# Altium footprint library 7SEG.PCBLIB: 23 footprints (part 1 of 2)
Each footprint in its own frame and in the unit in brackets; x right, y up, seen from the top. Pads: shape width x height; smd on the part's side, far side on the other; paste and mask are expansions set on the pad; w line width, h text height; cw(c..) or ccw(c..) is an arc to the next point about the centre after c.
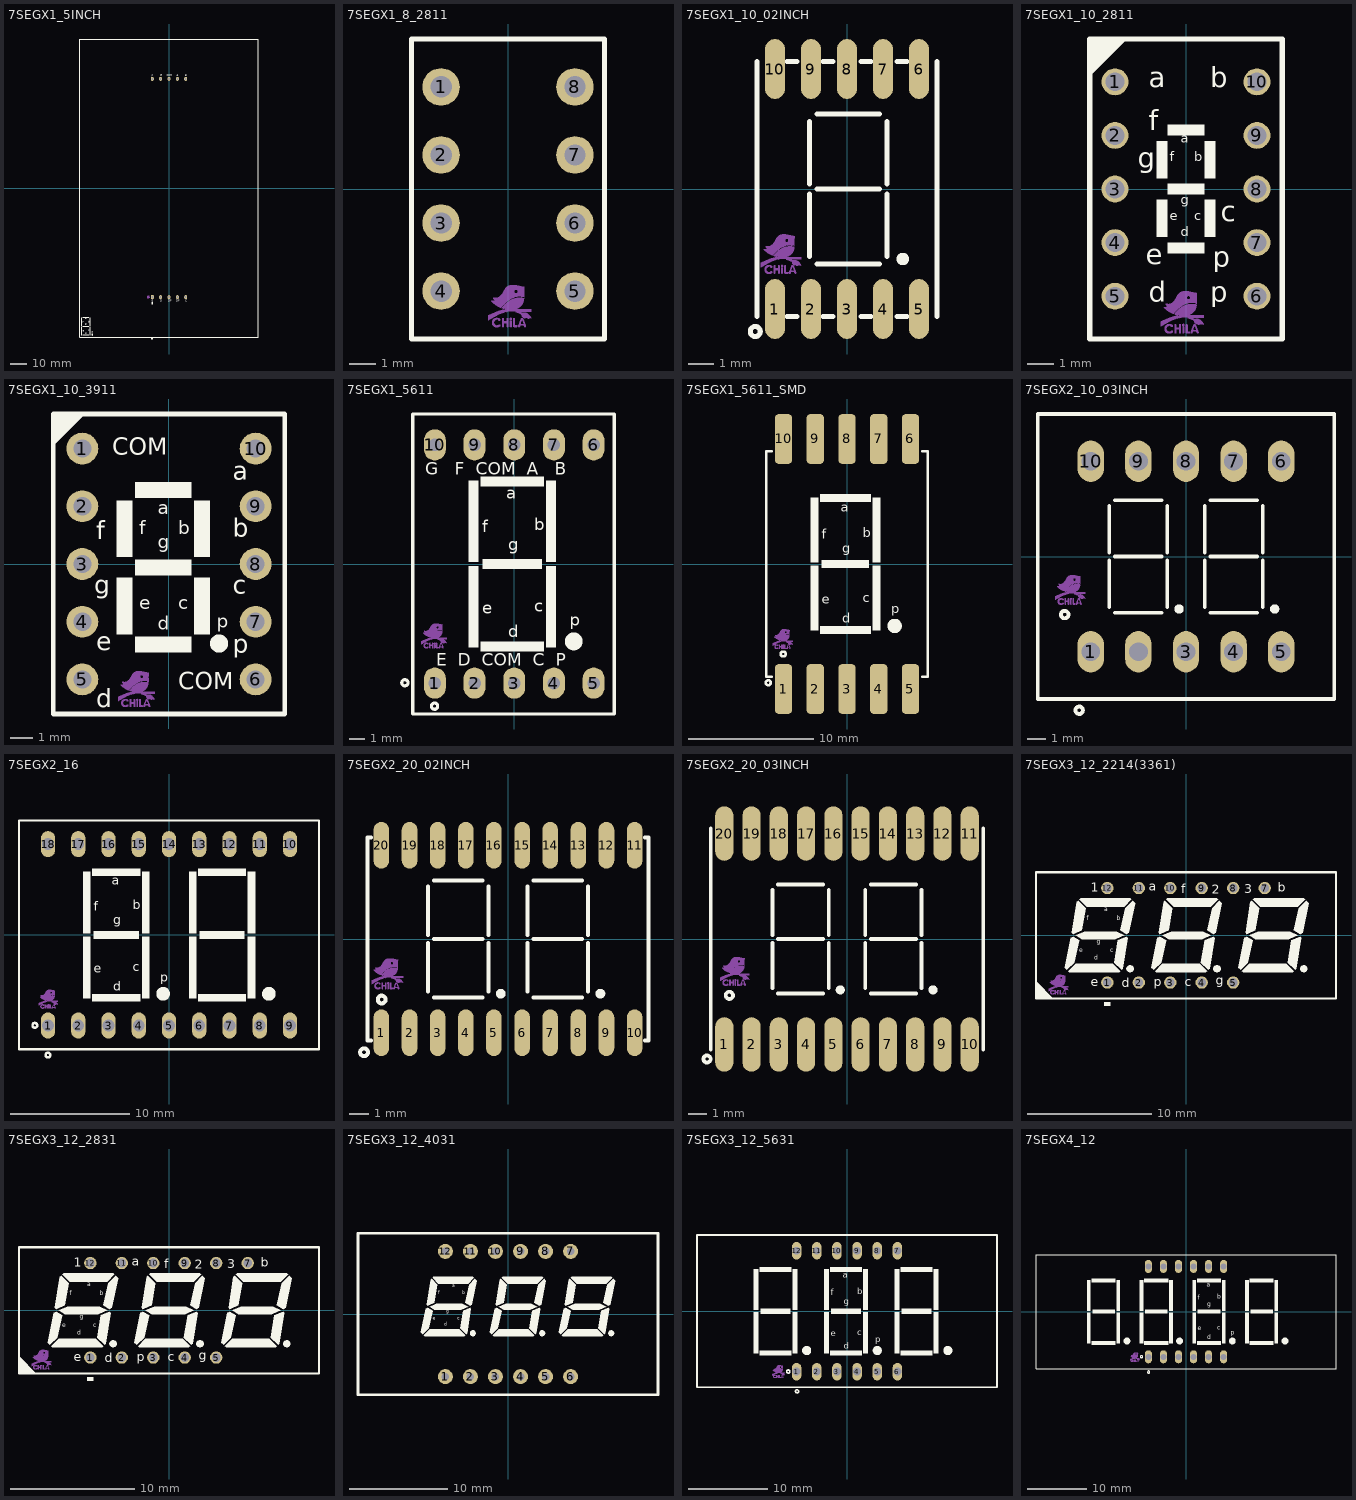
[diagram p0: the footprints below, top view; thin cyan lines are the x and y axes]

## 7SEGX1_5INCH [mm] "7SEG single 5INCH, 10pin, Pitch: 5.08mm, 180X108mm"
pads (10):
  rrect50% 1.8x2.4 hole 1.2: 1(-10.1,-66)
  oval 1.8x2.4 hole 1.2: 2(-5.1,-66) 3(0,-66) 4(5.1,-66) 5(10.1,-66) 6(10.1,66) 7(5.1,66) 8(0,66) 9(-5.1,66) 10(-10.1,66)
TopOverlay:
  circle w0.635: c-46.39,-88.653 r0.254
  circle w0.2: c-10.1,-69.7 r0.4
  circle w0.2: c-10.2,-90.9 r0.4
  rectangle: -52.232,-84.03 -48.422,-83.37
  rectangle: -52.359,-89.288 -48.295,-88.653
  rectangle: -52.359,-78.747 -48.295,-78.112
  rectangle: -48.168,-89.034 -47.533,-83.827
  rectangle: -48.168,-83.573 -47.533,-78.366
  rectangle: -53.121,-83.573 -52.486,-78.366
  rectangle: -53.121,-89.034 -52.486,-83.827
  lines w0.2: -54.1,-90.1 54.1,-90.1 54.1,90.1 -54.1,90.1 -54.1,-90.1
  text "E" at -10.3,-68.8 h1
  text "D" at -5.4,-68.7 h1
  text "DP" at -0.6,-68.7 h1
  text "DP" at 4.4,-68.7 h1
  text "C" at 9.8,-68.7 h1
  text "g" at -50.581,-82.811 h0.76
  text "p" at -46.644,-87.637 h0.76
  text "b" at -48.93,-81.541 h0.76
  text "e" at -52.232,-86.875 h0.76
  text "c" at -48.93,-86.748 h0.76
  text "d" at -50.581,-88.399 h0.76
  text "f" at -52.232,-81.668 h0.76
  text "a" at -50.708,-79.509 h0.76
  text "B" at 9.8,67.5 h1
  text "A" at 4.7,67.6 h1
  text "COM" at -1.3,67.5 h1
  text "G" at -5.4,67.5 h1
  text "F" at -10.3,67.4 h1
Mechanical16:
  drawing of 8 lines, arcs and shapes, not listed
3D body "User Library-7Segment_5inch.step": height 16, standoff -4.4, extent -54,-90 54,90

## 7SEGX1_8_2811 [mm] "7SEG single 8pin Pitch: 2.54mm  2811 0.28\" 8X10mm"
height 6
pads (8):
  round 1.4 / inner round 1.4 / far side oval 1.6x1.4 hole 0.8: 1(-2.5,3.81) 2(-2.5,1.27) 3(-2.5,-1.27) 4(-2.5,-3.81) 5(2.5,-3.81) 6(2.5,-1.27) 7(2.5,1.27) 8(2.5,3.81)
TopOverlay:
  lines w0.2: -3.6,-5.6 3.6,-5.6 3.6,5.6 -3.6,5.6 -3.6,-5.6
Mechanical16:
  drawing of 8 lines, arcs and shapes, not listed
3D body "la-301xb.stp": height 5, standoff -3.8, extent -3.5,-5.5 3.5,5.5

## 7SEGX1_10_02INCH [mm] "7SEG single 10pin Pitch: 1.44mm  0.2\" 10X7mm"
pads (10):
  oval 0.8x2.4 smd: 1(-2.88,-4.8) 2(-1.44,-4.8) 3(0,-4.8) 4(1.44,-4.8) 5(2.88,-4.8) 6(2.88,4.8) 7(1.44,4.8) 8(0,4.8) 9(-1.44,4.8) 10(-2.88,4.8)
TopOverlay:
  circle w0.25: c2.23,-2.8 r0.125
  circle w0.2: c-3.67,-5.7 r0.2
  lines w0.2: -3.6,-5.1 -3.6,5.1 ; -2.4,-5.1 -2,-5.1 ; -2.4,5.1 -2,5.1 ; -1.5,-2.7 -1.5,-0.2 ; -1.5,0.2 -1.5,2.7 ; -1.2,-3 1.3,-3 ; -1.2,0 1.3,0 ; -1.2,3 1.3,3 ; -0.96,-5.1 -0.56,-5.1 ; -0.96,5.1 -0.56,5.1 ; 0.56,-5.1 0.96,-5.1 ; 0.56,5.1 0.96,5.1 ; 1.6,-2.7 1.6,-0.2 ; 1.6,0.2 1.6,2.7 ; 2,-5.1 2.4,-5.1 ; 2,5.1 2.4,5.1 ; 3.6,-5.1 3.6,5.1
Mechanical16:
  drawing of 8 lines, arcs and shapes, not listed
3D body "ACSX02-41.STEP": height 3, standoff -0.05, extent -3.45,-5 3.45,5

## 7SEGX1_10_2811 [mm] "7SEG single 10pin Pitch: 2.54mm  2811 0.28\" 8X10mm"
height 6
pads (10):
  round 1 / inner round 1 / far side oval 1.4x1.2 hole 0.7: 1(-2.65,4) 2(-2.65,2) 3(-2.65,0) 4(-2.65,-2) 5(-2.65,-4) 6(2.65,-4) 7(2.65,-2) 8(2.65,0) 9(2.65,2) 10(2.65,4)
TopOverlay:
  rectangle: -0.7,-2.4 0.7,-2
  region: -1.1,-0.4 -1.1,-1.8 -0.7,-1.8 -0.7,-0.4
  region: 0.7,-0.4 0.7,-1.8 1.1,-1.8 1.1,-0.4
  rectangle: -0.7,-0.2 0.7,0.2
  region: 0.7,1.8 0.7,0.4 1.1,0.4 1.1,1.8
  region: -1.1,1.8 -1.1,0.4 -0.7,0.4 -0.7,1.8
  rectangle: -0.7,2 0.7,2.4
  region: -3.6,5.6 -2.2,5.6 -3.6,4.2
  lines w0.2: -3.6,-5.6 -3.6,5.6 3.6,5.6 3.6,-5.6 -3.6,-5.6
  text "p" at 1,-2.9 h0.75
  text "p" at 0.9,-4.2 h0.75
  text "a" at -1.4,3.8 h0.75
  text "d" at -1.4,-4.2 h0.75
  text "e" at -1.5,-2.8 h0.75
  text "f" at -1.4,2.2 h0.75
  text "b" at 0.9,3.8 h0.75
  text "g" at -1.8,0.8 h0.75
  text "c" at 1.3,-1.2 h0.75
  text "a" at -0.2,1.6 h0.6
  text "f" at -0.6,0.9 h0.6
  text "d" at -0.2,-1.9 h0.6
  text "c" at 0.3,-1.3 h0.6
  text "e" at -0.6,-1.3 h0.6
  text "b" at 0.3,0.9 h0.6
  text "g" at -0.2,-0.7 h0.6
Mechanical16:
  drawing of 8 lines, arcs and shapes, not listed
3D body "la-301xb.stp": height 5, standoff -3.8, extent -3.5,-5.5 3.5,5.5

## 7SEGX1_10_3911 [mm] "7SEG single 10pin Pitch: 2.54mm  3911 0.39\" 10X13mm"
height 7
pads (10):
  round 1.4 / inner round 1.4 / far side oval 2x1.4 hole 0.8: 1(-3.81,5.08) 2(-3.81,2.54) 3(-3.81,0) 4(-3.81,-2.54) 5(-3.81,-5.08) 6(3.81,-5.08) 7(3.81,-2.54) 8(3.81,0) 9(3.81,2.54) 10(3.81,5.08)
TopOverlay:
  circle w0.4: c2.2,-3.5 r0.2
  rectangle: -1.5,-0.5 1,0.2
  region: -1.6,0.3 -1.6,2.8 -2.3,2.8 -2.3,0.3
  rectangle: -1.5,2.9 1,3.6
  region: -2.3,-0.6 -2.3,-3.1 -1.6,-3.1 -1.6,-0.6
  region: 1.1,-0.6 1.1,-3.1 1.8,-3.1 1.8,-0.6
  region: 1.8,0.3 1.8,2.8 1.1,2.8 1.1,0.3
  rectangle: -1.5,-3.9 1,-3.2
  region: -5.1,6.6 -3.7,6.6 -5.1,5.2
  lines w0.2: -5.1,-6.6 -5.1,6.6 5.1,6.6 5.1,-6.6 -5.1,-6.6
  text "p" at 2.8,-3.9 h0.8
  text "a" at 2.8,3.7 h0.8
  text "d" at -3.2,-6.3 h0.8
  text "COM" at 0.4,-5.5 h0.76
  text "COM" at -2.5,4.8 h0.76
  text "e" at -3.2,-3.8 h0.8
  text "f" at -3.2,1.1 h0.8
  text "b" at 2.8,1.2 h0.8
  text "g" at -3.3,-1.3 h0.8
  text "c" at 2.8,-1.3 h0.8
  text "a" at -0.5,2.2 h0.6
  text "f" at -1.3,1.3 h0.6
  text "d" at -0.5,-2.9 h0.6
  text "c" at 0.4,-2 h0.6
  text "e" at -1.3,-2 h0.6
  text "b" at 0.4,1.3 h0.6
  text "p" at 2.1,-2.8 h0.6
  text "g" at -0.5,0.689 h0.6
Mechanical16:
  drawing of 8 lines, arcs and shapes, not listed
3D body "User Library-King Bright SA39-11.step": height 7, standoff -4, extent -5,-6.5 5,6.5

## 7SEGX1_5611 [mm] "7SEG single 10pin Pitch: 2.54mm  19X12.5mm"
height 8
pads (10):
  oval 1.4x2 hole 0.8: 1(-5.08,-7.62) 2(-2.54,-7.62) 3(0,-7.62) 4(2.54,-7.62) 5(5.08,-7.62) 6(5.08,7.62) 7(2.54,7.62) 8(0,7.62) 9(-2.54,7.62) 10(-5.08,7.62)
TopOverlay:
  circle w0.635: c3.81,-4.953 r0.254
  circle w0.2: c-7,-7.6 r0.2
  circle w0.2: c-5.1,-9.1 r0.2
  rectangle: -2.032,-0.33 1.778,0.33
  rectangle: -2.159,-5.588 1.905,-4.953
  rectangle: -2.159,4.953 1.905,5.588
  rectangle: 2.032,-5.334 2.667,-0.127
  rectangle: 2.032,0.127 2.667,5.334
  rectangle: -2.921,0.127 -2.286,5.334
  rectangle: -2.921,-5.334 -2.286,-0.127
  lines w0.2: -6.5,-9.6 6.4,-9.6 6.4,9.6 -6.5,9.6 -6.5,-9.6
  text "g" at -0.381,0.889 h0.76
  text "p" at 3.556,-3.937 h0.76
  text "b" at 1.27,2.159 h0.76
  text "e" at -2.032,-3.175 h0.76
  text "c" at 1.27,-3.048 h0.76
  text "d" at -0.381,-4.699 h0.76
  text "f" at -2.032,2.032 h0.76
  text "a" at -0.508,4.191 h0.76
  text "G   F  COM  A   B" at -5.7,5.7 h0.8
  text "E  D  COM  C  P" at -5,-6.5 h0.8
Mechanical16:
  drawing of 8 lines, arcs and shapes, not listed
3D body "User Library-KEM-5611.STEP": height 10, standoff -4.3, extent -6.3,-9.5 6.3,9.5

## 7SEGX1_5611_SMD [mm]
pads (10):
  rrect50% 1.4x4 smd: 1(-5.08,-10) 2(-2.54,-10) 3(0,-10) 4(2.54,-10) 5(5.08,-10) 6(5.08,10) 7(2.54,10) 8(0,10) 9(-2.54,10) 10(-5.08,10)
TopOverlay:
  circle w0.635: c3.81,-4.953 r0.254
  circle w0.2: c-6.3,-9.5 r0.2
  circle w0.2: c-5.1,-7.2 r0.2
  rectangle: -2.921,-5.334 -2.286,-0.127
  rectangle: -2.921,0.127 -2.286,5.334
  rectangle: 2.032,0.127 2.667,5.334
  rectangle: 2.032,-5.334 2.667,-0.127
  rectangle: -2.159,4.953 1.905,5.588
  rectangle: -2.159,-5.588 1.905,-4.953
  rectangle: -2.032,-0.33 1.778,0.33
  lines w0.2: -6,-9.017 -6.477,-9.017 -6.477,9.017 -6,9.017 ; 6,-9.017 6.477,-9.017 6.477,9.017 6,9.017
  text "a" at -0.508,4.191 h0.76
  text "f" at -2.032,2.032 h0.76
  text "d" at -0.381,-4.699 h0.76
  text "c" at 1.27,-3.048 h0.76
  text "e" at -2.032,-3.175 h0.76
  text "b" at 1.27,2.159 h0.76
  text "p" at 3.556,-3.937 h0.76
  text "g" at -0.381,0.889 h0.76
Mechanical16:
  drawing of 8 lines, arcs and shapes, not listed
3D body "User Library-KEM-5611.STEP": height 10, standoff -4.3, extent -6.3,-9.5 6.3,9.5

## 7SEGX2_10_03INCH [mm] "7SEG 2DIGIT 10pin Pitch: 2.54mm  0.3\", 15.5X15mm"
height 8
pads (10):
  oval 1.4x2.2 hole 1: 1(-5.08,-5.08) 3(0,-5.08) 4(2.54,-5.08) 5(5.08,-5.08) 6(5.08,5.08) 7(2.54,5.08) 8(0,5.08) 9(-2.54,5.08) 10(-5.08,5.08) ""(-2.54,-5.08)
TopOverlay:
  circle w0.2: c-6.47,-3.1 r0.2
  circle w0.2: c-5.7,-8.2 r0.2
  circle w0.25: c-0.37,-2.8 r0.125
  circle w0.25: c4.73,-2.8 r0.125
  lines w0.2: -4.1,-2.7 -4.1,-0.2 ; -4.1,0.2 -4.1,2.7 ; -3.8,-3 -1.3,-3 ; -3.8,0 -1.3,0 ; -3.8,3 -1.3,3 ; -1,-2.7 -1,-0.2 ; -1,0.2 -1,2.7 ; 1,-2.7 1,-0.2 ; 1,0.2 1,2.7 ; 1.3,-3 3.8,-3 ; 1.3,0 3.8,0 ; 1.3,3 3.8,3 ; 4.1,-2.7 4.1,-0.2 ; 4.1,0.2 4.1,2.7 ; -7.9,-7.6 -7.9,7.6 7.9,7.6 7.9,-7.6 -7.9,-7.6
Mechanical16:
  drawing of 8 lines, arcs and shapes, not listed
3D body "DX03-11.STEP": height 7.3, standoff -3.9, extent -7.75,-7.5 7.75,7.5

## 7SEGX2_16 [mm] "7SEG 2DIGIT 5621 0.56\", 16pin Pitch: 2.54mm, 19X25mm"
height 8
pads (18):
  oval 1.2x2.2 hole 1: 1(-10.16,-7.62) 2(-7.62,-7.62) 3(-5.08,-7.62) 4(-2.54,-7.62) 5(0,-7.62) 6(2.54,-7.62) 7(5.08,-7.62) 8(7.62,-7.62) 9(10.16,-7.62) 10(10.16,7.62) 11(7.62,7.62) 12(5.08,7.62) 13(2.54,7.62) 14(0,7.62) 15(-2.54,7.62) 16(-5.08,7.62) 17(-7.62,7.62) 18(-10.16,7.62)
TopOverlay:
  circle w0.2: c-10.17,-10.1 r0.2
  circle w0.2: c-11.27,-7.6 r0.2
  circle w0.635: c8.39,-4.953 r0.254
  circle w0.635: c-0.5,-4.953 r0.254
  rectangle: 1.659,-5.334 2.294,-0.127
  rectangle: 1.659,0.127 2.294,5.334
  rectangle: 6.612,0.127 7.247,5.334
  rectangle: 6.612,-5.334 7.247,-0.127
  rectangle: 2.421,4.953 6.485,5.588
  rectangle: 2.421,-5.588 6.485,-4.953
  rectangle: 2.548,-0.33 6.358,0.33
  rectangle: -6.342,-0.33 -2.532,0.33
  rectangle: -6.469,-5.588 -2.405,-4.953
  rectangle: -6.469,4.953 -2.405,5.588
  rectangle: -2.278,-5.334 -1.643,-0.127
  rectangle: -2.278,0.127 -1.643,5.334
  rectangle: -7.231,0.127 -6.596,5.334
  rectangle: -7.231,-5.334 -6.596,-0.127
  lines w0.2: -12.6,-9.6 12.6,-9.6 12.6,9.6 -12.6,9.6 -12.6,-9.6
  text "g" at -4.691,0.889 h0.76
  text "p" at -0.754,-3.937 h0.76
  text "b" at -3.04,2.159 h0.76
  text "e" at -6.342,-3.175 h0.76
  text "c" at -3.04,-3.048 h0.76
  text "d" at -4.691,-4.699 h0.76
  text "f" at -6.342,2.032 h0.76
  text "a" at -4.818,4.191 h0.76
Mechanical16:
  drawing of 8 lines, arcs and shapes, not listed
3D body "User Library-King Bright DX56_2DIG.step": height 8.2, standoff -3.8, extent -12.5,-9.525 12.5,9.525

## 7SEGX2_20_02INCH [mm] "7SEG 2DIGIT 20pin Pitch: 1.44mm  0.2\", 14X10mm"
height 8
pads (20):
  oval 0.8x2.4 smd: 1(-6.48,-4.8) 2(-5.04,-4.8) 3(-3.6,-4.8) 4(-2.16,-4.8) 5(-0.72,-4.8) 6(0.72,-4.8) 7(2.16,-4.8) 8(3.6,-4.8) 9(5.04,-4.8) 10(6.48,-4.8) 11(6.48,4.8) 12(5.04,4.8) 13(3.6,4.8) 14(2.16,4.8) 15(0.72,4.8) 16(-0.72,4.8) 17(-2.16,4.8) 18(-3.6,4.8) 19(-5.04,4.8) 20(-6.48,4.8)
TopOverlay:
  circle w0.25: c4.73,-2.8 r0.125
  circle w0.25: c-0.37,-2.8 r0.125
  circle w0.2: c-7.37,-5.8 r0.2
  circle w0.2: c-6.47,-3.1 r0.2
  lines w0.2: -7,-5.2 -7.2,-5.2 -7.2,5.2 -7,5.2 ; -4.1,-2.7 -4.1,-0.2 ; -4.1,0.2 -4.1,2.7 ; -3.8,-3 -1.3,-3 ; -3.8,0 -1.3,0 ; -3.8,3 -1.3,3 ; -1,-2.7 -1,-0.2 ; -1,0.2 -1,2.7 ; 1,-2.7 1,-0.2 ; 1,0.2 1,2.7 ; 1.3,-3 3.8,-3 ; 1.3,0 3.8,0 ; 1.3,3 3.8,3 ; 4.1,-2.7 4.1,-0.2 ; 4.1,0.2 4.1,2.7 ; 7,-5.2 7.2,-5.2 7.2,5.2 7,5.2
Mechanical16:
  drawing of 8 lines, arcs and shapes, not listed
3D body "ACDX02-41.STEP": height 3.1, standoff 0.05, extent -7.05,-5 7.05,5

## 7SEGX2_20_03INCH [mm] "7SEG 2DIGIT 20pin Pitch: 1.5mm  0.3\", 14.8X12mm"
height 8
pads (20):
  oval 1x3 smd: 1(-6.75,-5.8) 2(-5.25,-5.8) 3(-3.75,-5.8) 4(-2.25,-5.8) 5(-0.75,-5.8) 6(0.75,-5.8) 7(2.25,-5.8) 8(3.75,-5.8) 9(5.25,-5.8) 10(6.75,-5.8) 11(6.75,5.8) 12(5.25,5.8) 13(3.75,5.8) 14(2.25,5.8) 15(0.75,5.8) 16(-0.75,5.8) 17(-2.25,5.8) 18(-3.75,5.8) 19(-5.25,5.8) 20(-6.75,5.8)
TopOverlay:
  circle w0.25: c4.73,-2.8 r0.125
  circle w0.25: c-0.37,-2.8 r0.125
  circle w0.2: c-7.7,-6.6 r0.2
  circle w0.2: c-6.47,-3.1 r0.2
  lines w0.2: -7.5,-6.1 -7.5,6.1 ; -4.1,-2.7 -4.1,-0.2 ; -4.1,0.2 -4.1,2.7 ; -3.8,-3 -1.3,-3 ; -3.8,0 -1.3,0 ; -3.8,3 -1.3,3 ; -1,-2.7 -1,-0.2 ; -1,0.2 -1,2.7 ; 1,-2.7 1,-0.2 ; 1,0.2 1,2.7 ; 1.3,-3 3.8,-3 ; 1.3,0 3.8,0 ; 1.3,3 3.8,3 ; 4.1,-2.7 4.1,-0.2 ; 4.1,0.2 4.1,2.7 ; 7.5,-6.1 7.5,6.1
Mechanical16:
  drawing of 8 lines, arcs and shapes, not listed
3D body "ACDX03-41.STEP": height 3.8, standoff 0, extent -7.4,-6 7.4,6

## 7SEGX3_12_2214(3361) [mm] "7SEG single 12-1pin Pitch: 2.54mm  221422.6X114mm"
height 6
pads (11):
  round 1 / inner round 1 / far side oval 1.2x1.4 hole 0.7: 1(-6.35,-3.81) 2(-3.81,-3.81) 3(-1.27,-3.81) 4(1.27,-3.81) 5(3.81,-3.81) 7(6.35,3.81) 8(3.81,3.81) 9(1.27,3.81) 10(-1.27,3.81) 11(-3.81,3.81) 12(-6.35,3.81)
TopOverlay:
  drawing of 30 lines, arcs and shapes, not listed
  text "p" at -2.6,-4.1 h0.75
  text "a" at -3,3.6 h0.75
  text "d" at -5.2,-4.2 h0.75
  text "e" at -7.7,-4.1 h0.75
  text "f" at -0.4,3.4 h0.75
  text "b" at 7.4,3.5 h0.75
  text "g" at 2.4,-4 h0.75
  text "c" at -0.1,-4.1 h0.75
  text "a" at -6.6,1.8 h0.6
  text "f" at -8,1.1 h0.6
  text "d" at -7.4,-2.1 h0.6
  text "c" at -6.1,-1.5 h0.6
  text "e" at -8.6,-1.5 h0.6
  text "b" at -5.6,1.1 h0.6
  text "g" at -7.2,-0.8 h0.6
  text "3" at 4.7,3.4 h0.75
  text "2" at 2.072,3.359 h0.75
  text "1" at -7.7,3.5 h0.75
Mechanical16:
  drawing of 8 lines, arcs and shapes, not listed
3D body "SD-3361_X.STEP": height 0, standoff -13.3, extent -10.95,-7.3 11.55,6.7

## 7SEGX3_12_2831 [mm] "7SEG single 12-1pin Pitch: 2.54mm  2831 0.28\" 24X10X5.8mm"
height 6
pads (11):
  round 1 / inner round 1 / far side oval 1.2x1.4 hole 0.7: 1(-6.35,-3.81) 2(-3.81,-3.81) 3(-1.27,-3.81) 4(1.27,-3.81) 5(3.81,-3.81) 7(6.35,3.81) 8(3.81,3.81) 9(1.27,3.81) 10(-1.27,3.81) 11(-3.81,3.81) 12(-6.35,3.81)
TopOverlay:
  drawing of 30 lines, arcs and shapes, not listed
  text "p" at -2.6,-4.1 h0.75
  text "a" at -3,3.6 h0.75
  text "d" at -5.2,-4.2 h0.75
  text "e" at -7.7,-4.1 h0.75
  text "f" at -0.4,3.4 h0.75
  text "b" at 7.4,3.5 h0.75
  text "g" at 2.4,-4 h0.75
  text "c" at -0.1,-4.1 h0.75
  text "a" at -6.6,1.8 h0.6
  text "f" at -8,1.1 h0.6
  text "d" at -7.4,-2.1 h0.6
  text "c" at -6.1,-1.5 h0.6
  text "e" at -8.6,-1.5 h0.6
  text "b" at -5.6,1.1 h0.6
  text "g" at -7.2,-0.8 h0.6
  text "3" at 4.7,3.4 h0.75
  text "2" at 2.072,3.359 h0.75
  text "1" at -7.7,3.5 h0.75
Mechanical16:
  drawing of 8 lines, arcs and shapes, not listed
3D body "User Library-IND GNT-2831BD.step": height 5.81, standoff -3.5, extent -12,-5.01 12,5

## 7SEGX3_12_4031 [mil] "7SEG single 12-1pin Pitch: 2.54mm  3016 0.4\" 30X16X7mm"
height 236.22
pads (12):
  round 60 hole 30: 1(-250,-250) 2(-150,-250) 3(-50,-250) 4(50,-250) 5(150,-250) 6(250,-250) 7(250,250) 8(150,250) 9(50,250) 10(-50,250) 11(-150,250) 12(-250,250)
TopOverlay:
  drawing of 28 lines, arcs and shapes, not listed
  text "g" at -246.06,-1.97 h23.62
  text "b" at -183.07,72.83 h23.62
  text "e" at -301.18,-29.53 h23.62
  text "c" at -202.76,-29.53 h23.62
  text "d" at -253.94,-53.15 h23.62
  text "f" at -277.56,72.83 h23.62
  text "a" at -222.44,100.39 h23.62
3D body "SD-4301_X.x_t": height 314.96, standoff -39.37, extent -592.52,-314.96 592.52,314.96

## 7SEGX3_12_5631 [mm] "7SEG 3DIGIT 5631 0.56\", 12pin Pitch: 2.54mm, 19X37.5mm"
height 7.62
pads (12):
  oval 1.2x2.2 hole 1: 1(-6.35,-7.62) 2(-3.81,-7.62) 3(-1.27,-7.62) 4(1.27,-7.62) 5(3.81,-7.62) 6(6.35,-7.62) 7(6.35,7.62) 8(3.81,7.62) 9(1.27,7.62) 10(-1.27,7.62) 11(-3.81,7.62) 12(-6.35,7.62)
TopOverlay:
  circle w0.635: c3.81,-4.953 r0.254
  circle w0.635: c-5.08,-4.953 r0.254
  circle w0.635: c12.7,-4.953 r0.254
  circle w0.2: c-7.4,-7.6 r0.2
  circle w0.2: c-6.3,-10.1 r0.2
  rectangle: -10.922,-0.33 -7.112,0.33
  rectangle: -2.921,-5.334 -2.286,-0.127
  rectangle: -2.921,0.127 -2.286,5.334
  rectangle: 2.032,0.127 2.667,5.334
  rectangle: 2.032,-5.334 2.667,-0.127
  rectangle: -2.159,4.953 1.905,5.588
  rectangle: -2.159,-5.588 1.905,-4.953
  rectangle: -2.032,-0.33 1.778,0.33
  rectangle: -11.049,-5.588 -6.985,-4.953
  rectangle: -11.049,4.953 -6.985,5.588
  rectangle: -6.858,-5.334 -6.223,-0.127
  rectangle: -6.858,0.127 -6.223,5.334
  rectangle: -11.811,0.127 -11.176,5.334
  rectangle: -11.811,-5.334 -11.176,-0.127
  rectangle: 6.858,-0.33 10.668,0.33
  rectangle: 6.731,-5.588 10.795,-4.953
  rectangle: 6.731,4.953 10.795,5.588
  rectangle: 10.922,-5.334 11.557,-0.127
  rectangle: 10.922,0.127 11.557,5.334
  rectangle: 5.969,0.127 6.604,5.334
  rectangle: 5.969,-5.334 6.604,-0.127
  lines w0.2: -18.9,-9.6 -18.9,9.6 18.9,9.6 18.9,-9.6 -18.9,-9.6
  text "a" at -0.508,4.191 h0.76
  text "f" at -2.032,2.032 h0.76
  text "d" at -0.381,-4.699 h0.76
  text "c" at 1.27,-3.048 h0.76
  text "e" at -2.032,-3.175 h0.76
  text "b" at 1.27,2.159 h0.76
  text "p" at 3.556,-3.937 h0.76
  text "g" at -0.381,0.889 h0.76
Mechanical16:
  drawing of 8 lines, arcs and shapes, not listed
3D body "end-el-san Co Ltd-King Bright BX56-12A.step": height 8.2, standoff -3.9, extent -18.8,-9.5 18.8,9.5

## 7SEGX4_12 [mm] "7SEG 4DIGIT ,5641 0.56\", 12pin Pitch: 2.54mm, 19X50.3mm"
height 7.62
pads (12):
  oval 1.2x2.2 hole 1: 1(-6.35,-7.62) 2(-3.81,-7.62) 3(-1.27,-7.62) 4(1.27,-7.62) 5(3.81,-7.62) 6(6.35,-7.62) 7(6.35,7.62) 8(3.81,7.62) 9(1.27,7.62) 10(-1.27,7.62) 11(-3.81,7.62) 12(-6.35,7.62)
TopOverlay:
  circle w0.635: c-9.97,-4.953 r0.254
  circle w0.635: c16.7,-4.953 r0.254
  circle w0.635: c-1.08,-4.953 r0.254
  circle w0.635: c7.81,-4.953 r0.254
  circle w0.2: c-7.5,-7.6 r0.2
  circle w0.2: c-6.3,-10.2 r0.2
  rectangle: -15.812,-0.33 -12.002,0.33
  rectangle: -15.939,-5.588 -11.875,-4.953
  rectangle: -15.939,4.953 -11.875,5.588
  rectangle: -11.748,-5.334 -11.113,-0.127
  rectangle: -11.748,0.127 -11.113,5.334
  rectangle: -16.701,0.127 -16.066,5.334
  rectangle: -16.701,-5.334 -16.066,-0.127
  rectangle: 9.969,-5.334 10.604,-0.127
  rectangle: 9.969,0.127 10.604,5.334
  rectangle: 14.922,0.127 15.557,5.334
  rectangle: 14.922,-5.334 15.557,-0.127
  rectangle: 10.731,4.953 14.795,5.588
  rectangle: 10.731,-5.588 14.795,-4.953
  rectangle: 10.858,-0.33 14.668,0.33
  rectangle: -7.811,-5.334 -7.176,-0.127
  rectangle: -7.811,0.127 -7.176,5.334
  rectangle: -2.858,0.127 -2.223,5.334
  rectangle: -2.858,-5.334 -2.223,-0.127
  rectangle: -7.049,4.953 -2.985,5.588
  rectangle: -7.049,-5.588 -2.985,-4.953
  rectangle: 1.968,-0.33 5.778,0.33
  rectangle: 1.841,-5.588 5.905,-4.953
  rectangle: 1.841,4.953 5.905,5.588
  rectangle: 6.032,-5.334 6.667,-0.127
  rectangle: 6.032,0.127 6.667,5.334
  rectangle: 1.079,0.127 1.714,5.334
  rectangle: 1.079,-5.334 1.714,-0.127
  rectangle: -6.922,-0.33 -3.112,0.33
  lines w0.2: -25.3,-9.6 25.3,-9.6 25.3,9.6 -25.3,9.6 -25.3,-9.6
  text "g" at 3.619,0.889 h0.76
  text "p" at 7.556,-3.937 h0.76
  text "b" at 5.27,2.159 h0.76
  text "e" at 1.968,-3.175 h0.76
  text "c" at 5.27,-3.048 h0.76
  text "d" at 3.619,-4.699 h0.76
  text "f" at 1.968,2.032 h0.76
  text "a" at 3.492,4.191 h0.76
Mechanical16:
  drawing of 8 lines, arcs and shapes, not listed
3D body "User Library-C-564 (7 segment 4 digit LED display).step": height 8, standoff -6.2, extent -25.2,-9.5 25.2,9.5